# Altium footprint library HDR2.54.PcbLib: 242 footprints (part 15 of 16)
Each footprint in its own frame and in the unit in brackets; x right, y up, seen from the top. Pads: shape width x height; smd on the part's side, far side on the other; paste and mask are expansions set on the pad; w line width, h text height; cw(c..) or ccw(c..) is an arc to the next point about the centre after c.
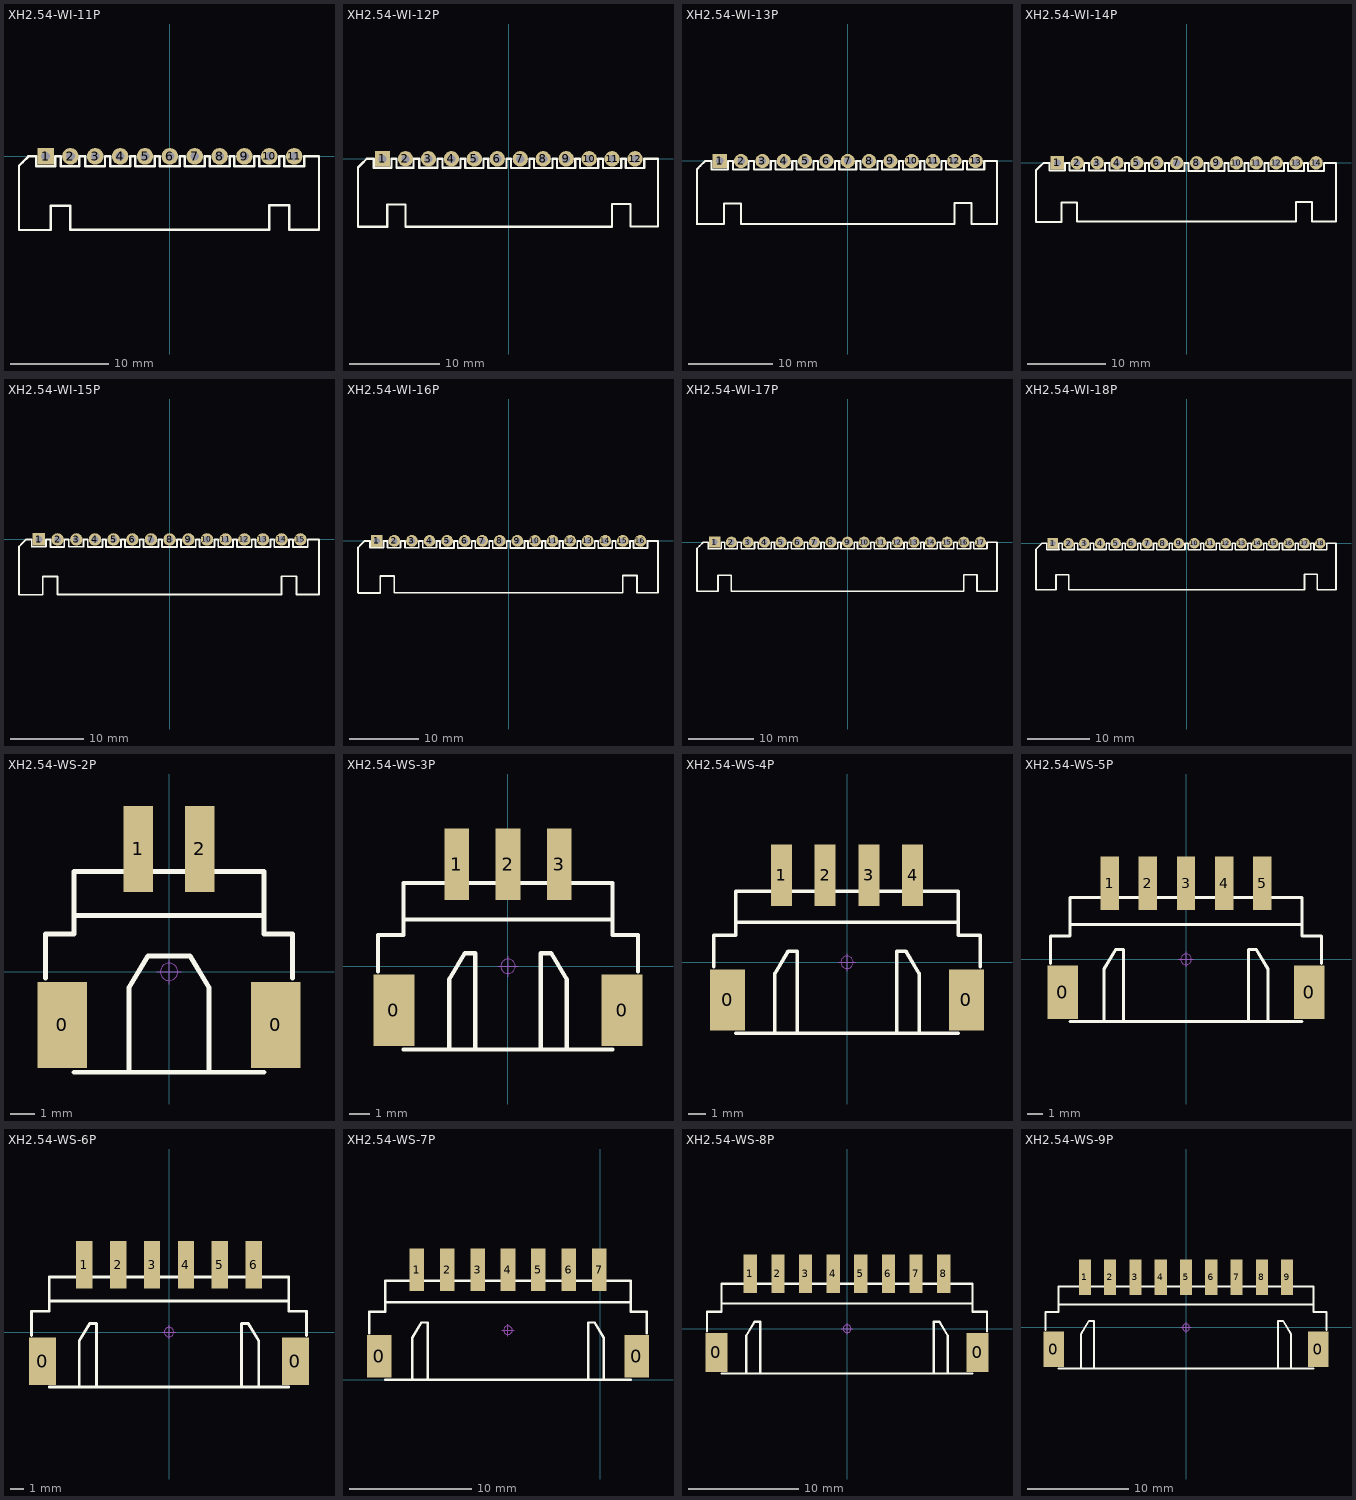
[diagram p14: the footprints below, top view; thin cyan lines are the x and y axes]

## XH2.54-WI-11P [mm] "�Ӳ����11P"
pads (11):
  rect 1.7x1.7 hole 0.9: 1(-12.7,0)
  round 1.7 hole 0.9: 2(-10.16,0) 3(-7.62,0) 4(-5.08,0) 5(-2.54,0) 6(0,0) 7(2.54,0) 8(5.08,0) 9(7.62,0) 10(10.16,0) 11(12.7,0)
Top Overlay:
  lines w0.254: -9.266,0 -9.266,-0.988 -9.28,-1.002 -11.146,-1.002 -11.146,0 -11.718,0 -11.718,-0.982 -11.704,-0.996 -13.66,-0.996 -13.674,-0.982 -13.674,0 -14.45,0 -15.032,-0.582 -15.416,-0.966 -15.416,-7.502 -15.39,-7.528 -12.192,-7.528 -12.192,-5.058 -10.16,-5.058 -10.16,-7.502 10.16,-7.502 10.16,-5.006 12.192,-5.006 12.192,-7.49 15.24,-7.49 15.24,0 13.716,0 13.716,-1.016 11.684,-1.016 11.684,0 11.176,0 11.176,-1.016 9.144,-1.016 9.144,0 8.636,0 8.636,-1.016 6.604,-1.016 6.604,0 6.096,0 6.096,-1.016 4.064,-1.016 4.064,0 3.556,0 3.556,-1.016 1.524,-1.016 1.524,0 1.016,0 1.016,-1.016 -1.016,-1.016 -1.016,0 -1.524,0 -1.524,-1.016 -3.556,-1.016 -3.556,0 -4.064,0 -4.064,-1.002 -6.068,-1.002 -6.068,0 ; -9.254,0 -8.656,0 ; -8.642,-0.996 -8.642,0 ; -8.622,-0.996 -6.634,-0.996 -6.628,-0.99 -6.628,0 -6.082,0
3D body "XH2.54-11P_H.STEP": height 5.73, standoff -3.37, extent -15.2,-7.35 15.2,0.35

## XH2.54-WI-12P [mm] "�Ӳ����12P"
pads (12):
  rect 1.7x1.7 hole 0.9: 1(-13.97,0)
  round 1.7 hole 0.9: 2(-11.43,0) 3(-8.89,0) 4(-6.35,0) 5(-3.81,0) 6(-1.27,0) 7(1.27,0) 8(3.81,0) 9(6.35,0) 10(8.89,0) 11(11.43,0) 12(13.97,0)
Top Overlay:
  lines w0.254: -10.536,0 -10.536,-0.988 -10.55,-1.002 -12.416,-1.002 -12.416,0 -12.988,0 -12.988,-0.982 -12.974,-0.996 -14.93,-0.996 -14.944,-0.982 -14.944,0 -15.72,0 -16.302,-0.582 -16.686,-0.966 -16.686,-7.502 -16.66,-7.528 -13.462,-7.528 -13.462,-5.058 -11.43,-5.058 -11.43,-7.502 11.43,-7.502 11.43,-5.006 13.462,-5.006 13.462,-7.49 16.51,-7.49 16.51,0 14.986,0 14.986,-1.016 12.954,-1.016 12.954,0 12.446,0 12.446,-1.016 10.414,-1.016 10.414,0 9.906,0 9.906,-1.016 7.874,-1.016 7.874,0 7.366,0 7.366,-1.016 5.334,-1.016 5.334,0 4.826,0 4.826,-1.016 2.794,-1.016 2.794,0 2.286,0 2.286,-1.016 0.254,-1.016 0.254,0 -0.254,0 -0.254,-1.016 -2.286,-1.016 -2.286,0 -2.794,0 -2.794,-1.016 -4.826,-1.016 -4.826,0 -5.334,0 -5.334,-1.002 -7.338,-1.002 -7.338,0 ; -10.524,0 -9.926,0 ; -9.912,-0.996 -9.912,0 ; -9.892,-0.996 -7.904,-0.996 -7.898,-0.99 -7.898,0 -7.352,0
3D body "XH2.54-12P_H.STEP": height 5.75, standoff -3.35, extent -16.47,-7.35 16.47,0.35

## XH2.54-WI-13P [mm] "�Ӳ����13P"
pads (13):
  rect 1.7x1.7 hole 0.9: 1(-15.24,0)
  round 1.7 hole 0.9: 2(-12.7,0) 3(-10.16,0) 4(-7.62,0) 5(-5.08,0) 6(-2.54,0) 7(0,0) 8(2.54,0) 9(5.08,0) 10(7.62,0) 11(10.16,0) 12(12.7,0) 13(15.24,0)
Top Overlay:
  lines w0.254: -11.806,0 -11.806,-0.988 -11.82,-1.002 -13.686,-1.002 -13.686,0 -14.258,0 -14.258,-0.982 -14.244,-0.996 -16.2,-0.996 -16.214,-0.982 -16.214,0 -16.99,0 -17.572,-0.582 -17.956,-0.966 -17.956,-7.502 -17.93,-7.528 -14.732,-7.528 -14.732,-5.058 -12.7,-5.058 -12.7,-7.502 12.7,-7.502 12.7,-5.006 14.732,-5.006 14.732,-7.49 17.78,-7.49 17.78,0 16.256,0 16.256,-1.016 14.224,-1.016 14.224,0 13.716,0 13.716,-1.016 11.684,-1.016 11.684,0 11.176,0 11.176,-1.016 9.144,-1.016 9.144,0 8.636,0 8.636,-1.016 6.604,-1.016 6.604,0 6.096,0 6.096,-1.016 4.064,-1.016 4.064,0 3.556,0 3.556,-1.016 1.524,-1.016 1.524,0 1.016,0 1.016,-1.016 -1.016,-1.016 -1.016,0 -1.524,0 -1.524,-1.016 -3.556,-1.016 -3.556,0 -4.064,0 -4.064,-1.016 -6.096,-1.016 -6.096,0 -6.604,0 -6.604,-1.002 -8.608,-1.002 -8.608,0 ; -11.794,0 -11.196,0 ; -11.182,-0.996 -11.182,0 ; -11.162,-0.996 -9.174,-0.996 -9.168,-0.99 -9.168,0 -8.622,0
3D body "XH2.54-13P_H.STEP": height 5.75, standoff -3.35, extent -17.74,-7.35 17.74,0.35

## XH2.54-WI-14P [mm] "�Ӳ����14P"
pads (14):
  rect 1.7x1.7 hole 0.9: 1(-16.51,0)
  round 1.7 hole 0.9: 2(-13.97,0) 3(-11.43,0) 4(-8.89,0) 5(-6.35,0) 6(-3.81,0) 7(-1.27,0) 8(1.27,0) 9(3.81,0) 10(6.35,0) 11(8.89,0) 12(11.43,0) 13(13.97,0) 14(16.51,0)
Top Overlay:
  lines w0.254: -13.076,0 -13.076,-0.988 -13.09,-1.002 -14.956,-1.002 -14.956,0 -15.528,0 -15.528,-0.982 -15.514,-0.996 -17.47,-0.996 -17.484,-0.982 -17.484,0 -18.26,0 -18.842,-0.582 -19.226,-0.966 -19.226,-7.502 -19.2,-7.528 -16.002,-7.528 -16.002,-5.058 -13.97,-5.058 -13.97,-7.502 13.97,-7.502 13.97,-5.006 16.002,-5.006 16.002,-7.49 19.05,-7.49 19.05,0 17.526,0 17.526,-1.016 15.494,-1.016 15.494,0 14.986,0 14.986,-1.016 12.954,-1.016 12.954,0 12.446,0 12.446,-1.016 10.414,-1.016 10.414,0 9.906,0 9.906,-1.016 7.874,-1.016 7.874,0 7.366,0 7.366,-1.016 5.334,-1.016 5.334,0 4.826,0 4.826,-1.016 2.794,-1.016 2.794,0 2.286,0 2.286,-1.016 0.254,-1.016 0.254,0 -0.254,0 -0.254,-1.016 -2.286,-1.016 -2.286,0 -2.794,0 -2.794,-1.016 -4.826,-1.016 -4.826,0 -5.334,0 -5.334,-1.016 -7.366,-1.016 -7.366,0 -7.874,0 -7.874,-1.002 -9.878,-1.002 -9.878,0 ; -13.064,0 -12.466,0 ; -12.452,-0.996 -12.452,0 ; -12.432,-0.996 -10.444,-0.996 -10.438,-0.99 -10.438,0 -9.892,0
3D body "XH2.54-14P_H.STEP": height 5.75, standoff -3.35, extent -19.01,-7.35 19.01,0.35

## XH2.54-WI-15P [mm] "�Ӳ����15P"
pads (15):
  rect 1.7x1.7 hole 0.9: 1(-17.78,0)
  round 1.7 hole 0.9: 2(-15.24,0) 3(-12.7,0) 4(-10.16,0) 5(-7.62,0) 6(-5.08,0) 7(-2.54,0) 8(0,0) 9(2.54,0) 10(5.08,0) 11(7.62,0) 12(10.16,0) 13(12.7,0) 14(15.24,0) 15(17.78,0)
Top Overlay:
  lines w0.254: -14.346,0 -14.346,-0.988 -14.36,-1.002 -16.226,-1.002 -16.226,0 -16.798,0 -16.798,-0.982 -16.784,-0.996 -18.74,-0.996 -18.754,-0.982 -18.754,0 -19.53,0 -20.112,-0.582 -20.496,-0.966 -20.496,-7.502 -20.47,-7.528 -17.272,-7.528 -17.272,-5.058 -15.24,-5.058 -15.24,-7.502 15.24,-7.502 15.24,-5.006 17.272,-5.006 17.272,-7.49 20.32,-7.49 20.32,0 18.796,0 18.796,-1.016 16.764,-1.016 16.764,0 16.256,0 16.256,-1.016 14.224,-1.016 14.224,0 13.716,0 13.716,-1.016 11.684,-1.016 11.684,0 11.176,0 11.176,-1.016 9.144,-1.016 9.144,0 8.636,0 8.636,-1.016 6.604,-1.016 6.604,0 6.096,0 6.096,-1.016 4.064,-1.016 4.064,0 3.556,0 3.556,-1.016 1.524,-1.016 1.524,0 1.016,0 1.016,-1.016 -1.016,-1.016 -1.016,0 -1.524,0 -1.524,-1.016 -3.556,-1.016 -3.556,0 -4.064,0 -4.064,-1.016 -6.096,-1.016 -6.096,0 -6.604,0 -6.604,-1.016 -8.636,-1.016 -8.636,0 -9.144,0 -9.144,-1.002 -11.148,-1.002 -11.148,0 ; -14.334,0 -13.736,0 ; -13.722,-0.996 -13.722,0 ; -13.702,-0.996 -11.714,-0.996 -11.708,-0.99 -11.708,0 -11.162,0
3D body "XH2.54-15P_H.STEP": height 5.75, standoff -3.35, extent -20.28,-7.35 20.28,0.35

## XH2.54-WI-16P [mm] "�Ӳ����16P"
pads (16):
  rect 1.7x1.7 hole 0.9: 1(-19.05,0)
  round 1.7 hole 0.9: 2(-16.51,0) 3(-13.97,0) 4(-11.43,0) 5(-8.89,0) 6(-6.35,0) 7(-3.81,0) 8(-1.27,0) 9(1.27,0) 10(3.81,0) 11(6.35,0) 12(8.89,0) 13(11.43,0) 14(13.97,0) 15(16.51,0) 16(19.05,0)
Top Overlay:
  lines w0.254: -15.616,0 -15.616,-0.988 -15.63,-1.002 -17.496,-1.002 -17.496,0 -18.068,0 -18.068,-0.982 -18.054,-0.996 -20.01,-0.996 -20.024,-0.982 -20.024,0 -20.8,0 -21.382,-0.582 -21.766,-0.966 -21.766,-7.502 -21.74,-7.528 -18.542,-7.528 -18.542,-5.058 -16.51,-5.058 -16.51,-7.502 16.51,-7.502 16.51,-5.006 18.542,-5.006 18.542,-7.49 21.59,-7.49 21.59,0 20.066,0 20.066,-1.016 18.034,-1.016 18.034,0 17.526,0 17.526,-1.016 15.494,-1.016 15.494,0 14.986,0 14.986,-1.016 12.954,-1.016 12.954,0 12.446,0 12.446,-1.016 10.414,-1.016 10.414,0 9.906,0 9.906,-1.016 7.874,-1.016 7.874,0 7.366,0 7.366,-1.016 5.334,-1.016 5.334,0 4.826,0 4.826,-1.016 2.794,-1.016 2.794,0 2.286,0 2.286,-1.016 0.254,-1.016 0.254,0 -0.254,0 -0.254,-1.016 -2.286,-1.016 -2.286,0 -2.794,0 -2.794,-1.016 -4.826,-1.016 -4.826,0 -5.334,0 -5.334,-1.016 -7.366,-1.016 -7.366,0 -7.874,0 -7.874,-1.016 -9.906,-1.016 -9.906,0 -10.414,0 -10.414,-1.002 -12.418,-1.002 -12.418,0 ; -15.604,0 -15.006,0 ; -14.992,-0.996 -14.992,0 ; -14.972,-0.996 -12.984,-0.996 -12.978,-0.99 -12.978,0 -12.432,0
3D body "XH2.54-16P_H.STEP": height 5.75, standoff -3.35, extent -21.55,-7.35 21.55,0.35

## XH2.54-WI-17P [mm] "�Ӳ����17P"
pads (17):
  rect 1.7x1.7 hole 0.9: 1(-20.32,0)
  round 1.7 hole 0.9: 2(-17.78,0) 3(-15.24,0) 4(-12.7,0) 5(-10.16,0) 6(-7.62,0) 7(-5.08,0) 8(-2.54,0) 9(0,0) 10(2.54,0) 11(5.08,0) 12(7.62,0) 13(10.16,0) 14(12.7,0) 15(15.24,0) 16(17.78,0) 17(20.32,0)
Top Overlay:
  lines w0.254: -16.886,0 -16.886,-0.988 -16.9,-1.002 -18.766,-1.002 -18.766,0 -19.338,0 -19.338,-0.982 -19.324,-0.996 -21.28,-0.996 -21.294,-0.982 -21.294,0 -22.07,0 -22.652,-0.582 -23.036,-0.966 -23.036,-7.502 -23.01,-7.528 -19.812,-7.528 -19.812,-5.058 -17.78,-5.058 -17.78,-7.502 17.78,-7.502 17.78,-5.006 19.812,-5.006 19.812,-7.49 22.86,-7.49 22.86,0 21.336,0 21.336,-1.016 19.304,-1.016 19.304,0 18.796,0 18.796,-1.016 16.764,-1.016 16.764,0 16.256,0 ; -16.874,0 -16.276,0 ; -16.262,-0.996 -16.262,0 ; -16.242,-0.996 -14.254,-0.996 -14.248,-0.99 -14.248,0 -13.702,0 ; -13.688,0 -13.688,-1.002 -11.684,-1.002 -11.684,0 -11.176,0 -11.176,-1.016 -9.144,-1.016 -9.144,0 -8.636,0 -8.636,-1.016 -6.604,-1.016 -6.604,0 -6.096,0 -6.096,-1.016 -4.064,-1.016 -4.064,0 -3.556,0 -3.556,-1.016 -1.524,-1.016 -1.524,0 -1.016,0 -1.016,-1.016 1.016,-1.016 1.016,0 1.524,0 1.524,-1.016 3.556,-1.016 3.556,0 4.064,0 4.064,-1.016 6.096,-1.016 6.096,0 6.604,0 6.604,-1.016 8.636,-1.016 8.636,0 9.144,0 9.144,-1.016 11.176,-1.016 11.176,0 11.684,0 11.684,-1.016 13.716,-1.016 13.716,0 ; 13.716,0 14.224,0 ; 13.716,0 14.224,0 ; 14.224,-1.016 16.256,-1.016 ; 14.224,-1.016 14.224,0 ; 14.224,-1.016 16.256,-1.016 ; 14.224,-1.016 14.224,0 ; 16.256,-1.016 16.256,0 ; 16.256,-1.016 16.256,0
3D body "XH2.54-17P_H.STEP": height 5.75, standoff -3.35, extent -22.82,-7.35 22.82,0.35

## XH2.54-WI-18P [mm] "�Ӳ����18P"
pads (18):
  rect 1.7x1.7 hole 0.9: 1(-21.59,0)
  round 1.7 hole 0.9: 2(-19.05,0) 3(-16.51,0) 4(-13.97,0) 5(-11.43,0) 6(-8.89,0) 7(-6.35,0) 8(-3.81,0) 9(-1.27,0) 10(1.27,0) 11(3.81,0) 12(6.35,0) 13(8.89,0) 14(11.43,0) 15(13.97,0) 16(16.51,0) 17(19.05,0) 18(21.59,0)
Top Overlay:
  lines w0.254: -18.156,0 -18.156,-0.988 -18.17,-1.002 -20.036,-1.002 -20.036,0 -20.608,0 -20.608,-0.982 -20.594,-0.996 -22.55,-0.996 -22.564,-0.982 -22.564,0 -23.34,0 -23.922,-0.582 -24.306,-0.966 -24.306,-7.502 -24.28,-7.528 -21.082,-7.528 -21.082,-5.058 -19.05,-5.058 -19.05,-7.502 19.05,-7.502 19.05,-5.006 21.082,-5.006 21.082,-7.49 24.13,-7.49 24.13,0 22.606,0 22.606,-1.016 20.574,-1.016 20.574,0 20.066,0 20.066,-1.016 18.034,-1.016 18.034,0 17.526,0 17.526,-1.016 15.494,-1.016 15.494,0 14.986,0 14.986,-1.016 12.954,-1.016 12.954,0 12.446,0 12.446,-1.016 10.414,-1.016 10.414,0 9.906,0 9.906,-1.016 7.874,-1.016 7.874,0 7.366,0 7.366,-1.016 5.334,-1.016 5.334,0 4.826,0 4.826,-1.016 2.794,-1.016 2.794,0 2.286,0 2.286,-1.016 0.254,-1.016 0.254,0 -0.254,0 -0.254,-1.016 -2.286,-1.016 -2.286,0 -2.794,0 -2.794,-1.016 -4.826,-1.016 -4.826,0 -5.334,0 -5.334,-1.016 -7.366,-1.016 -7.366,0 -7.874,0 -7.874,-1.016 -9.906,-1.016 -9.906,0 -10.414,0 -10.414,-1.016 -12.446,-1.016 -12.446,0 -12.954,0 -12.954,-1.002 -14.958,-1.002 -14.958,0 ; -18.144,0 -17.546,0 ; -17.532,-0.996 -17.532,0 ; -17.512,-0.996 -15.524,-0.996 -15.518,-0.99 -15.518,0 -14.972,0
3D body "XH2.54-18P_H.STEP": height 5.75, standoff -3.35, extent -24.09,-7.35 21.55,0.35

## XH2.54-WS-2P [mm] "����10mm�����8mm���ߣ�6.1mm   �Ա�ID:�ƾ���ʯ   ������ַ:https://shop463601444.taobao.com"
pads (4):
  rect 2x3.5 smd: 0(-4.327,-2.15) 0(4.327,-2.15)
  rect 1.2x3.5 smd: 1(-1.25,4.981) 2(1.25,4.981)
Top Overlay:
  lines w0.2: -5,-0.254 -5,1.536 -3.85,1.536 -3.85,4.064 3.85,4.064 3.85,1.536 5,1.536 5,-0.254 ; -3.85,-4.064 3.85,-4.064 ; -3.85,2.286 3.85,2.286 ; -1.62,-4.064 -1.62,-0.634 -0.858,0.636 -0.35,0.636 0.858,0.636 1.62,-0.634 1.62,-4.064
Mechanical 15:
  circle w0.05: c0,0 r0.35
  lines w0.05: -0.5,0 0.5,0 ; 0,-0.5 0,0.5
3D body "XH2.54-WS-2P.STEP": height 6.05, standoff -0.01, extent -5,-4 5,6.418

## XH2.54-WS-3P [mm] "����12.5mm�����8mm���ߣ�6.1mm   �Ա�ID:�ƾ���ʯ   ������ַ:https://shop463601444.taobao.com"
pads (5):
  rect 2x3.5 smd: 0(-5.577,-2.15) 0(5.577,-2.15)
  rect 1.2x3.5 smd: 1(-2.5,4.981) 2(0,4.981) 3(2.5,4.981)
Top Overlay:
  lines w0.2: -6.35,-0.254 -6.35,1.536 -5.1,1.536 -5.1,4.064 5.1,4.064 5.1,1.536 6.35,1.536 6.35,-0.254 ; -5.1,-4.064 5.1,-4.064 ; -5.1,2.286 5.1,2.286 ; -2.87,-4.064 -2.87,-0.634 -2.108,0.636 -1.6,0.636 -1.6,-4.064 ; 1.6,-4.064 1.6,0.636 2.108,0.636 2.87,-0.634 2.87,-4.064
Mechanical 15:
  circle w0.05: c0,0 r0.35
  lines w0.05: -0.5,0 0.5,0 ; 0,-0.5 0,0.5
3D body "XH2.54-WS-3P.STEP": height 6.05, standoff -0.01, extent -6.25,-4 6.25,6.418

## XH2.54-WS-4P [mm] "����15mm�����8mm���ߣ�6.1mm   �Ա�ID:�ƾ���ʯ   ������ַ:https://shop463601444.taobao.com"
pads (6):
  rect 2x3.5 smd: 0(-6.827,-2.15) 0(6.827,-2.15)
  rect 1.2x3.5 smd: 1(-3.75,4.981) 2(-1.25,4.981) 3(1.25,4.981) 4(3.75,4.981)
Top Overlay:
  lines w0.2: -7.62,-0.254 -7.62,1.536 -6.35,1.536 -6.35,4.064 6.35,4.064 6.35,1.536 7.62,1.536 7.62,-0.254 ; -6.35,-4.064 6.35,-4.064 ; -6.35,2.286 6.35,2.286 ; -4.12,-4.064 -4.12,-0.634 -3.358,0.636 -2.85,0.636 -2.85,-4.064 ; 2.85,-4.064 2.85,0.636 3.358,0.636 4.12,-0.634 4.12,-4.064
Mechanical 15:
  circle w0.05: c0,0 r0.35
  lines w0.05: -0.5,0 0.5,0 ; 0,-0.5 0,0.5
3D body "XH2.54-WS-4P.STEP": height 6.05, standoff -0.01, extent -7.5,-4 7.5,6.418

## XH2.54-WS-5P [mm] "����17.5mm�����8mm���ߣ�6.1mm"
pads (7):
  rect 2x3.5 smd: 0(-8.077,-2.15) 0(8.077,-2.15)
  rect 1.2x3.5 smd: 1(-5,4.981) 2(-2.5,4.981) 3(0,4.981) 4(2.5,4.981) 5(5,4.981)
Top Overlay:
  lines w0.2: -8.89,-0.254 -8.89,1.536 -7.6,1.536 -7.6,4.064 7.6,4.064 7.6,1.536 8.89,1.536 8.89,-0.254 ; -7.6,-4.064 7.6,-4.064 ; -7.6,2.286 7.6,2.286 ; -5.37,-4.064 -5.37,-0.634 -4.608,0.636 -4.1,0.636 -4.1,-4.064 ; 4.1,-4.064 4.1,0.636 4.608,0.636 5.37,-0.634 5.37,-4.064
Mechanical 15:
  circle w0.05: c0,0 r0.35
  lines w0.05: -0.5,0 0.5,0 ; 0,-0.5 0,0.5
3D body "XH2.54-WS-5P.STEP": height 6.05, standoff -0.01, extent -8.75,-4 8.75,6.418

## XH2.54-WS-6P [mm] "����20mm�����8mm���ߣ�6.1mm"
pads (8):
  rect 2x3.5 smd: 0(-9.327,-2.15) 0(9.327,-2.15)
  rect 1.2x3.5 smd: 1(-6.25,4.981) 2(-3.75,4.981) 3(-1.25,4.981) 4(1.25,4.981) 5(3.75,4.981) 6(6.25,4.981)
Top Overlay:
  lines w0.2: -10.16,-0.254 -10.16,1.536 -8.85,1.536 -8.85,4.064 8.85,4.064 8.85,1.536 10.16,1.536 10.16,-0.254 ; -8.85,-4.064 8.85,-4.064 ; -8.85,2.286 8.85,2.286 ; -6.62,-4.064 -6.62,-0.634 -5.858,0.636 -5.35,0.636 -5.35,-4.064 ; 5.35,-4.064 5.35,0.636 5.858,0.636 6.62,-0.634 6.62,-4.064
Mechanical 15:
  circle w0.05: c0,0 r0.35
  lines w0.05: -0.5,0 0.5,0 ; 0,-0.5 0,0.5
3D body "XH2.54-WS-6P.STEP": height 6.05, standoff -0.01, extent -10,-4 10,6.418

## XH2.54-WS-7P [mm] "����22.5mm�����8mm���ߣ�6.1mm"
pads (9):
  rect 2x3.5 smd: 0(-18.177,1.914) 0(2.977,1.914)
  rect 1.2x3.5 smd: 1(-15.1,9.045) 2(-12.6,9.045) 3(-10.1,9.045) 4(-7.6,9.045) 5(-5.1,9.045) 6(-2.6,9.045) 7(-0.1,9.045)
Top Overlay:
  lines w0.2: -19.01,3.81 -19.01,5.6 -17.7,5.6 -17.7,8.128 2.5,8.128 2.5,5.6 3.81,5.6 3.81,3.81 ; -17.7,0 2.5,0 ; -17.7,6.35 2.5,6.35 ; -15.47,0 -15.47,3.43 -14.708,4.7 -14.2,4.7 -14.2,0 ; -1,0 -1,4.7 -0.492,4.7 0.27,3.43 0.27,0
Mechanical 15:
  circle w0.05: c-7.6,4.064 r0.35
  lines w0.05: -8.1,4.064 -7.1,4.064 ; -7.6,3.564 -7.6,4.564
3D body "XH2.54-WS-7P.STEP": height 6.05, standoff -0.01, extent -18.85,0.064 3.65,10.482

## XH2.54-WS-8P [mm] "����25mm�����8mm���ߣ�6.1mm"
pads (10):
  rect 2x3.5 smd: 0(-11.827,-2.15) 0(11.827,-2.15)
  rect 1.2x3.5 smd: 1(-8.75,4.981) 2(-6.25,4.981) 3(-3.75,4.981) 4(-1.25,4.981) 5(1.25,4.981) 6(3.75,4.981) 7(6.25,4.981) 8(8.75,4.981)
Top Overlay:
  lines w0.2: -12.66,-0.254 -12.66,1.536 -11.35,1.536 -11.35,4.064 11.35,4.064 11.35,1.536 12.66,1.536 12.66,-0.254 ; -11.35,-4.064 11.35,-4.064 ; -11.35,2.286 11.35,2.286 ; -9.12,-4.064 -9.12,-0.634 -8.358,0.636 -7.85,0.636 -7.85,-4.064 ; 7.85,-4.064 7.85,0.636 8.358,0.636 9.12,-0.634 9.12,-4.064
Mechanical 15:
  circle w0.05: c0,0 r0.35
  lines w0.05: -0.5,0 0.5,0 ; 0,-0.5 0,0.5
3D body "XH2.54-WS-8P.STEP": height 6.05, standoff -0.01, extent -12.5,-4 12.5,6.418

## XH2.54-WS-9P [mm] "����27.5mm�����8mm���ߣ�6.1mm"
pads (11):
  rect 2x3.5 smd: 0(-13.077,-2.15) 0(13.077,-2.15)
  rect 1.2x3.5 smd: 1(-10,4.981) 2(-7.5,4.981) 3(-5,4.981) 4(-2.5,4.981) 5(0,4.981) 6(2.5,4.981) 7(5,4.981) 8(7.5,4.981) 9(10,4.981)
Top Overlay:
  lines w0.2: -13.91,-0.254 -13.91,1.536 -12.6,1.536 -12.6,4.064 12.6,4.064 12.6,1.536 13.91,1.536 13.91,-0.254 ; -12.6,-4.064 12.6,-4.064 ; -12.6,2.286 12.6,2.286 ; -10.37,-4.064 -10.37,-0.634 -9.608,0.636 -9.1,0.636 -9.1,-4.064 ; 9.1,-4.064 9.1,0.636 9.608,0.636 10.37,-0.634 10.37,-4.064
Mechanical 15:
  circle w0.05: c0,0 r0.35
  lines w0.05: -0.5,0 0.5,0 ; 0,-0.5 0,0.5
3D body "XH2.54-WS-9P.STEP": height 6.05, standoff -0.01, extent -13.75,-4 13.75,6.418